# Altium footprint library Power_PCB.PcbLib: 52 footprints (part 4 of 4)
Each footprint in its own frame and in the unit in brackets; x right, y up, seen from the top. Pads: shape width x height; smd on the part's side, far side on the other; paste and mask are expansions set on the pad; w line width, h text height; cw(c..) or ccw(c..) is an arc to the next point about the centre after c.
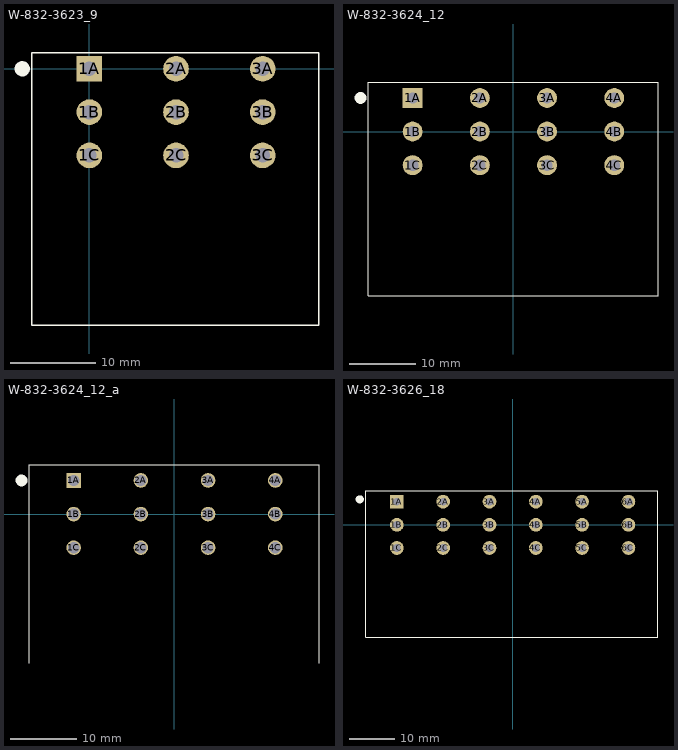
[diagram p3: the footprints below, top view; thin cyan lines are the x and y axes]

## W-832-3623_9 [mm]
pads (9):
  rect 3x3 hole 1.702 mask+0: 1A(0,0)
  round 3 hole 1.702 mask+0: 1B(0,-5.08) 1C(0,-10.16) 2A(10.16,0) 2B(10.16,-5.08) 2C(10.16,-10.16) 3A(20.32,0) 3B(20.32,-5.08) 3C(20.32,-10.16)
Top Overlay:
  circle w1.016: c-7.874,0 r0.381
  lines w0.152: -6.731,-30.099 -6.731,1.905 26.924,1.905 26.924,-30.099 -6.731,-30.099
3D body "832-3623.stp": height 16.5, standoff -4, extent -6.65,-30.095 26.97,1.905
3D body: height 0.25, standoff 0, extent 0,0 0.254,0.254

## W-832-3624_12 [mm]
pads (12):
  rect 3x3 hole 1.702 mask+0: 1A(-15.24,5.08)
  round 3 hole 1.702 mask+0: 1B(-15.24,0) 1C(-15.24,-5.08) 2A(-5.08,5.08) 2B(-5.08,0) 2C(-5.08,-5.08) 3A(5.08,5.08) 3B(5.08,0) 3C(5.08,-5.08) 4A(15.24,5.08) 4B(15.24,0) 4C(15.24,-5.08)
Top Overlay:
  circle w1.016: c-23.114,5.08 r0.381
  lines w0.127: -21.971,-24.811 21.844,-24.811 21.844,7.447 -21.971,7.447 -21.971,-24.811
3D body "832-3624.stp": height 16.5, standoff -4, extent -22.017,-24.634 21.763,7.366
3D body: height 0.25, standoff 0, extent -15.24,5.08 -14.986,5.334

## W-832-3624_12_a [mil]
pads (12):
  rect 87x87 hole 67 mask+0: 1A(-600,200)
  round 87 hole 67 mask+0: 1B(-600,0) 1C(-600,-200) 2A(-200,200) 2B(-200,0) 2C(-200,-200) 3A(200,200) 3B(200,0) 3C(200,-200) 4A(600,200) 4B(600,0) 4C(600,-200)
Top Overlay:
  circle w40: c-910,200 r15
  lines w5: -865,-887.4 -865,293.19 860,293.19 860,-887.4
3D body "832-3624.stp": height 649.61, standoff -157.48, extent -866.81,-969.84 856.81,290
3D body: height 10, standoff 0, extent -600,200 -590,210

## W-832-3626_18 [mm]
pads (18):
  rect 3x3 hole 1.702 mask+0: 1A(-25.4,5.08)
  round 3 hole 1.702 mask+0: 1B(-25.4,0) 1C(-25.4,-5.08) 2A(-15.24,5.08) 2B(-15.24,0) 2C(-15.24,-5.08) 3A(-5.08,5.08) 3B(-5.08,0) 3C(-5.08,-5.08) 4A(5.08,5.08) 4B(5.08,0) 4C(5.08,-5.08) 5A(15.24,5.08) 5B(15.24,0) 5C(15.24,-5.08) 6A(25.4,5.08) 6B(25.4,0) 6C(25.4,-5.08)
Top Overlay:
  circle w1.016: c-33.528,5.588 r0.381
  lines w0.152: -32.258,-24.638 -32.258,7.447 31.877,7.447 31.877,-24.638 -32.258,-24.638
3D body "832-3626.stp": height 16.5, standoff -4, extent -32.177,-24.634 31.923,7.366
3D body: height 0.25, standoff 0, extent -25.4,5.08 -25.146,5.334